# Altium schematic symbol library Electronic Devices_LIB.SchLib: 703 symbols (part 2 of 8) (continued)
## CONN_HEADER_JLINK_1.27mm_10p
designator J?, comment 3220-10-0300-00
Conn Shrouded Header (4 Sides) HDR 10 POS 1.27mm Solder ST SMD; Manufacturer: CNC Tech; Number of Positions: 10; Current Rating: 1A; Number of Contacts: 10NUMBER; Voltage Rating: 50V; Pitch: 0.05inch; Supplier 1: Digikey; Manufacturer Part Number: 3220-10-0300-00; RoHS: Yes; Category: Headers and Wire Housings; Stock 1: 504959; Pricing 1: 1=0.78, 10=0.676, 80=0.5575, 440=0.4848, 3200=0.3636, 6400=0.35148, 12800=0.32239 (USD); Mount: Surface Mount; Contact Plating: Gold; Contact Material: Brass; Contact Shape: Square; Contact Finish - Mating: GOLD; Insulation Material: Nylon; Min Operating Temperature: -40°C; Max Operating Temperature: 105°C; Number of Rows: 2; Connector Type: Header; Contact Type: Male Pin; Series: -; Packaging: Tray; Package Quantity: 320; Termination: Solder; Fastening Type: Pull; Height: 5.55mm; Row Spacing: 0.05inch; Flammability Rating: UL94 V-0; RoHS Compliant: Yes; ComponentLink1URL: https://datasheet.ciiva.com/18655/3220-xx-0300-00-18655365.pdf?src-supplier=Digikey; ComponentLink1Description: https://datasheet.ciiva.com/18655/3220-xx-0300-00-18655365.pdf?src-supplier=Digikey; Supplier Part Number 1: 1175-1629-ND
footprint CONN_JLINK_HEADER_322010030000
pins: 1, 2, 3, 4, 5, 6, 7, 8, 9, 10

## CONN_HEADER_MALE_2P_2.54_61300211121
designator J?, comment 61300211121
THT Vertical Pin Header WR-PHD, Pitch 2.54 mm, Single Row, 2 pins; Manufacturer: Wurth Electronics; Current Rating: 3A; Voltage Rating: 250V; Number of Positions: 2; Gender: 29Gender; Contact Resistance: 20mR; Pitch: 0.1inch; Supplier 1: Digikey; Manufacturer Part Number: 61300211121; RoHS: Yes; Category: Headers and Wire Housings; Stock 1: 91042; Pricing 1: 1=0.13, 10=0.113, 25=0.094, 50=0.079, 100=0.071, 1000=0.065 (USD); Mount: Through Hole; Contact Plating: Gold; Housing Material: PBT; Contact Material: Copper Alloy,Copper; Color: Black; Min Operating Temperature: -40°C; Max Operating Temperature: 125°C; Number of Rows: 1; Contact Gender: Male; Packaging: Bulk; Termination: Through Hole; Number of Contacts: 2; Series: WR-PHD; Contact Type: Male Pin; Operating Supply Voltage: 250V; Orientation: Vertical; Height: 8.94mm; Contact Mating Length: 0.236inch; Lead Free: Lead Free; RoHS Compliant: Yes; Reach SVHC Compliant: Unknown; ComponentLink1URL: https://datasheet.ciiva.com/13619/6130xx11121-48870-13619345.pdf?src-supplier=Mouser; ComponentLink1Description: https://datasheet.ciiva.com/13619/6130xx11121-48870-13619345.pdf?src-supplier=Mouser; Supplier Part Number 1: 732-5315-ND
footprint HEADER_MALE_HDRV2W110P0X254_1X2_508X254X854P
pins: 1, 2

## CONN_HEADER_MALE_3P_2.54mm_TSW-103-07-G-S
designator J?, comment TSW-103-07-G-S
Conn Unshrouded Header HDR 3 POS 2.54mm Solder ST Top Entry Thru-Hole Bulk; Manufacturer: Samtec; Number of Contacts: 3; Gender: Male; Max Current Rating: 7.6A; Max Voltage Rating (AC): 550V; Supplier 1: Digikey; Manufacturer Part Number: TSW-103-07-G-S; RoHS: Yes; Category: Board to Board Connectors; Stock 1: 5646; Pricing 1: 1=0.61, 10=0.494, 100=0.403, 500=0.3493, 1000=0.32848, 5000=0.28482, 10000=0.2735 (USD); Mount: Through Hole; Contact Plating: Gold; Contact Material: Bronze; Housing Color: Black; Housing Material: Polyester; Color: Black; Min Operating Temperature: -55°C; Max Operating Temperature: 125°C; Number of Rows: 1; Packaging: Bulk; Termination: Solder; Number of Positions: 3; Series: TSW; Contact Type: Male Pin; Orientation: Vertical; Package Quantity: 1; Length: 7.62mm; Pitch: 2.54mm; Depth: 2.54mm; Contact Mating Length: 0.23inch; RoHS Compliant: Yes; Lead Free: Lead Free; Reach SVHC Compliant: No; ComponentLink1URL: https://datasheet.ciiva.com/6889/tsw-xxx-xx-xxx-x-xx-xxx-mkt-6889655.pdf?src-supplier=Digikey; ComponentLink1Description: https://datasheet.ciiva.com/6889/tsw-xxx-xx-xxx-x-xx-xxx-mkt-6889655.pdf?src-supplier=Digikey; ComponentLink2URL: https://datasheet.ciiva.com/7124/tsw-th-7124622.pdf?src-supplier=Newark; ComponentLink2Description: https://datasheet.ciiva.com/7124/tsw-th-7124622.pdf?src-supplier=Newark; Supplier Part Number 1: SAM1029-03-ND
footprint CONN_HEADER_MALE_SAMTEC_TSW-103-07-G-S
pins: 1, 2, 3

## CONN_HEADER_MALE_4P_2.54mm
designator J?, comment 68001-204HLF
Conn Unshrouded Header HDR 4 POS 2.54mm Solder ST Thru-Hole Bag; Manufacturer: Amphenol ICC / FCI; Number of Positions: 4; Current Rating: 3A; Insulation Resistance: 5GR; Voltage Rating: 1.5kV; Contact Post Length: 3.05mm; Supplier 1: Digikey; Manufacturer Part Number: 68001-204HLF; RoHS: No; Category: Headers and Wire Housings; Stock 1: 3677; Pricing 1: 1=0.51, 10=0.388, 100=0.2643, 500=0.24106, 1000=0.19734, 5000=0.17678, 10000=0.17484 (USD); Mount: Through Hole; Contact Plating: Gold,GXT; Color: Black; Contact Material: Bronze; Housing Material: Thermoplastic; Min Operating Temperature: -65°C; Max Operating Temperature: 125°C; Packaging: Bulk; Number of Rows: 1; Termination: Solder; Contact Gender: Male; Number of Contacts: 4; Orientation: Straight; Series: BERGSTIK® II, MezzSelect™, Basics+; Contact Type: Male Pin; Package Quantity: 100; Pitch: 2.54mm; Contact Mating Length: 0.23inch; Radiation Hardening: No; Flammability Rating: UL94 V-0; ComponentLink1URL: http://uk.rs-online.com/webdocs/1450/0900766b81450c68.pdf?src-supplier=Rs; ComponentLink1Description: http://uk.rs-online.com/webdocs/1450/0900766b81450c68.pdf?src-supplier=Rs; ComponentLink2URL: http://components.arrow.com/part/dataview/42735081S8853857N8314?src-supplier=Arrow+Electronics; ComponentLink2Description: http://components.arrow.com/part/dataview/42735081S8853857N8314?src-supplier=Arrow+Electronics; ComponentLink3URL: https://cdn.amphenol-icc.com/media/wysiwyg/files/drawing/68000.pdf?src-supplier=Avnet; ComponentLink3Description: https://cdn.amphenol-icc.com/media/wysiwyg/files/drawing/68000.pdf?src-supplier=Avnet; ComponentLink4URL: https://cdn.amphenol-icc.com/media/wysiwyg/files/drawing/68000.pdf?src-supplier=Allied+Electronics; ComponentLink4Description: https://cdn.amphenol-icc.com/media/wysiwyg/files/drawing/68000.pdf?src-supplier=Allied+Electronics; ComponentLink5URL: https://datasheet.octopart.com/68001-204HLF-Amphenol-Communications-Solutions-datasheet-100449246.pdf?src-supplier=Future+Electronics; ComponentLink5Description: https://datasheet.octopart.com/68001-204HLF-Amphenol-Communications-Solutions-datasheet-100449246.pdf?src-supplier=Future+Electronics; ComponentLink6URL: https://cdn.amphenol-icc.com/media/wysiwyg/files/drawing/68000.pdf?src-supplier=Digikey; ComponentLink6Description: https://cdn.amphenol-icc.com/media/wysiwyg/files/drawing/68000.pdf?src-supplier=Digikey; ComponentLink7URL: https://datasheet.octopart.com/68001-204HLF-Amphenol-Communications-Solutions-datasheet-41232361.pdf?src-supplier=Element14; ComponentLink7Description: https://datasheet.octopart.com/68001-204HLF-Amphenol-Communications-Solutions-datasheet-41232361.pdf?src-supplier=Element14; ComponentLink8URL: https://cdn.amphenol-icc.com/media/wysiwyg/files/drawing/68000.pdf?src-supplier=Mouser; ComponentLink8Description: https://cdn.amphenol-icc.com/media/wysiwyg/files/drawing/68000.pdf?src-supplier=Mouser; ComponentLink9URL: https://cdn.amphenol-icc.com/media/wysiwyg/files/drawing/68000.pdf?src-supplier=TTI; ComponentLink9Description: https://cdn.amphenol-icc.com/media/wysiwyg/files/drawing/68000.pdf?src-supplier=TTI; ComponentLink10URL: https://cdn.amphenol-icc.com/media/wysiwyg/files/drawing/68000.pdf?src-supplier=Heilind+Electronics; ComponentLink10Description: https://cdn.amphenol-icc.com/media/wysiwyg/files/drawing/68000.pdf?src-supplier=Heilind+Electronics; ComponentLink11URL: https://datasheet.octopart.com/68001-204HLF-Amphenol-Communications-Solutions-datasheet-154727322.pdf?src-supplier=Master+Electronics; ComponentLink11Description: https://datasheet.octopart.com/68001-204HLF-Amphenol-Communications-Solutions-datasheet-154727322.pdf?src-supplier=Master+Electronics; Supplier Part Number 1: 609-3402-ND
footprint CONN_HDR_MALE_5P (2.54mm Pitch,tht)
pins: 1, 2, 3, 4

## CONN_HEADER_MALE_5P_2.54mm
designator J?, comment PH1-05-UA  (value not drawn)
Conn Unshrouded Header HDR 5 POS 2.54mm Solder ST Thru-Hole; Manufacturer: Adam Equipment; Number of Positions: 5; Manufacturer Part Number: PH1-05-UA; RoHS: Yes; Category: Connectors; Stock 1: 33214; Pricing 1: 1=0.10000, 10=0.07900, 100=0.05860, 500=0.04848, 1000=0.04242, 5000=0.03636, 10000=0.03535 (USD); Mount: Through Hole; Packaging: Bag; Pitch: 2.54mm; Lead Free: Lead Free; ComponentLink1URL: http://www.adam-tech.com/downloader.php?p=PH1-XX-UA.pdf&src-supplier=Digi-Key; ComponentLink1Description: http://www.adam-tech.com/downloader.php?p=PH1-XX-UA.pdf&src-supplier=Digi-Key; ComponentLink2URL: http://www.adam-tech.com/rick/FinalSingle/CatPg250-254.pdf?src-supplier=Future+Electronics; ComponentLink2Description: http://www.adam-tech.com/rick/FinalSingle/CatPg250-254.pdf?src-supplier=Future+Electronics; Supplier 1: Digi-Key; Supplier 2: Arrow Electronics; Supplier 3: Verical; Supplier Part Number 1: 2057-PH1-05-UA-ND; Supplier Part Number 2: PH1-05-UA; Supplier Part Number 3: PH1-05-UA; Supplier 4: Digi-Key; Supplier Part Number 4: 2057-PH1-06-UA-ND
footprint CONN_HDR_MALE_5P (2.54mm Pitch,tht)
pins: 1, 2, 3, 4, 5

## CONN_HEADER_MALE_6P_2.54mm
designator J?, comment PH1-06-UA
PH Series 6 Position Through Hole Single Row Straight .100 Header; Manufacturer: Adam Equipment; Number of Positions: 6; Pitch: 2.54mm; Supplier 1: Digi-Key; Manufacturer Part Number: PH1-06-UA; RoHS: Yes; Category: Connectors; Stock 1: 30623; Pricing 1: 1=0.13000, 10=0.09900, 100=0.07320, 500=0.06060, 1000=0.05302, 5000=0.04545, 10000=0.04419 (USD); Mount: Through Hole; Contact Plating: Gold; Number of Contacts: 6; Packaging: Bag; Number of Rows: 1; Lead Free: Lead Free; ComponentLink1URL: http://www.adam-tech.com/catalog/2012/page_312-315.pdf?src-supplier=Future+Electronics; ComponentLink1Description: http://www.adam-tech.com/catalog/2012/page_312-315.pdf?src-supplier=Future+Electronics; Supplier Part Number 1: 2057-PH1-06-UA-ND
footprint CONN_HDR_MALE_6P (2.54mm Pitch,tht)
pins: 1, 2, 3, 4, 5, 6

## CONN_HEADER_MALE_6P_2R_2.54mm_PH2-06-UA
designator J?, comment PH2-06-UA
Conn Unshrouded Header HDR 6 POS 2.54mm Solder ST Thru-Hole Bag; Manufacturer: Adam Equipment; Supplier 1: Digi-Key; Manufacturer Part Number: PH2-06-UA; RoHS: Yes; Category: Connectors; Stock 1: 52253; Pricing 1: 1=0.13, 10=0.1, 100=0.0735, 500=0.06084, 1000=0.05324, 5000=0.04563, 10000=0.04436 (USD); Lead Free: Lead Free; ComponentLink1URL: https://datasheet.ciiva.com/16479/page-292-295-16479745.pdf?src-supplier=Future+Electronics; ComponentLink1Description: https://datasheet.ciiva.com/16479/page-292-295-16479745.pdf?src-supplier=Future+Electronics; Supplier Part Number 1: 2057-PH2-06-UA-ND
footprint CONN_HDR_HDRV6W64P254_2X3_762X500X901P (Pitch 2.54mm)
pins: 1, 2, 3, 4, 5, 6

## CONN_HEADER_MALE_7P_2.54mm
designator J?, comment PH1-07-UA
Pin Header 7P .100" Pitch Plug; Manufacturer: Adam Equipment; Number of Contacts: 7; Supplier 1: Digi-Key; Manufacturer Part Number: PH1-07-UA; RoHS: No; Category: Connectors; Stock 1: 22523; Pricing 1: 1=0.15000, 10=0.11900, 100=0.08790, 500=0.07272, 1000=0.06363, 5000=0.05454, 10000=0.05303 (USD); Contact Plating: Gold; Packaging: Bag; Number of Rows: 1; Lead Free: Lead Free; Supplier Part Number 1: 2057-PH1-07-UA-ND
footprint CONN_HDR_MALE_7P (2.54mm Pitch,tht)
pins: 1, 2, 3, 4, 5, 6, 7

## CONN_HEADER_MALE_8P_2.54MM
designator J?, comment 2PH1-08-UA
Conn Unshrouded Header HDR 8 POS 2mm Solder ST Top Entry Thru-Hole Bag; Manufacturer: Adam Equipment; Number of Positions: 8; Voltage Rating (AC): 250V; Supplier 1: Arrow Electronics; Manufacturer Part Number: 2PH1-08-UA; RoHS: No; Category: Connectors; Stock 1: 8; Pricing 1: 1=0.1208, 10=0.1021, 100=0.1004 (USD); Mount: Through Hole; Contact Material: Brass; Contact Shape: Square; Contact Finish - Mating: GOLD; Insulation Material: PBT; Insulation Color: Black; Min Operating Temperature: -55°C; Max Operating Temperature: 105°C; Connector Type: Header; Fastening Type: Pull; Series: 2PH1; Packaging: Bulk; Contact Type: Male Pin; Number of Rows: 1; Termination: Solder; Flammability Rating: UL94 V-0; ComponentLink1URL: http://datasheet.octopart.com/2PH1-08-UA-Adam-Tech-datasheet-21182828.pdf?src-supplier=Arrow+Electronics; ComponentLink1Description: http://datasheet.octopart.com/2PH1-08-UA-Adam-Tech-datasheet-21182828.pdf?src-supplier=Arrow+Electronics; ComponentLink2URL: http://datasheet.octopart.com/2PH1-08-UA-Adam-Tech-datasheet-21182828.pdf?src-supplier=Allied+Electronics; ComponentLink2Description: http://datasheet.octopart.com/2PH1-08-UA-Adam-Tech-datasheet-21182828.pdf?src-supplier=Allied+Electronics; ComponentLink3URL: http://datasheet.octopart.com/2PH1-08-UA-Adam-Tech-datasheet-21182828.pdf?src-supplier=Digi-Key; ComponentLink3Description: http://datasheet.octopart.com/2PH1-08-UA-Adam-Tech-datasheet-21182828.pdf?src-supplier=Digi-Key; ComponentLink4URL: http://datasheet.octopart.com/2PH1-08-UA-Adam-Tech-datasheet-21182828.pdf?src-supplier=Beyond+Components; ComponentLink4Description: http://datasheet.octopart.com/2PH1-08-UA-Adam-Tech-datasheet-21182828.pdf?src-supplier=Beyond+Components; Supplier Part Number 1: 2PH1-08-UA
footprint CONN_HDR_MALE_8P (2.54mm Pitch,tht)
pins: 1, 2, 3, 4, 5, 6, 7, 8

## CONN_HEADER_MALE_10P_2.54mm_PH1-10-UA
designator J?, comment PH1-10-UA
Conn Unshrouded Header HDR 12 POS 2.54mm Solder RA Side Entry Thru-Hole Bag; Manufacturer: Adam Equipment; Number of Positions: 10; Voltage Rating (AC): 250V; Supplier 1: Digikey; Manufacturer Part Number: PH1-10-UA; RoHS: Yes; Category: Connectors; Stock 1: 3363; Pricing 1: 1=0.19, 10=0.144, 100=0.1095, 500=0.09102, 1000=0.08424, 5000=0.07078, 10000=0.06586 (USD); Contact Material: Brass; Contact Shape: Square; Contact Finish - Mating: GOLD; Insulation Material: PBT; Insulation Color: Black; Min Operating Temperature: -40°C; Max Operating Temperature: 105°C; Number of Rows: 1; Termination: Solder; Series: PH1; Connector Type: Header; Fastening Type: Pull; Packaging: Bulk; Contact Type: Male Pin; Pitch: 2.54mm; Flammability Rating: UL94 V-0; ComponentLink1URL: https://datasheet.ciiva.com/13676/page-292-295-13676646.pdf?src-supplier=Mouser; ComponentLink1Description: https://datasheet.ciiva.com/13676/page-292-295-13676646.pdf?src-supplier=Mouser; Supplier Part Number 1: 2057-PH1-10-UA-ND
footprint CONN_HEADER_MALE_10P
pins: 1, 2, 3, 4, 5, 6, 7, 8, 9, 10

## CONN_HEADER_MALE_10P_2R_1.27MM
designator J?, comment 20021121-00010C4LF
Conn Unshrouded Header HDR 10 POS 1.27mm Solder ST Top Entry SMD Minitek127® T/R; Manufacturer: Amphenol ICC / FCI; Number of Contacts: 10; Current Rating: 1A; Voltage Rating: 125V; Contact Resistance: 30mR; Row Spacing: 0.05inch; Stack Height: 3mm; Supplier 1: Newark; Manufacturer Part Number: 20021121-00010C4LF; RoHS: No; Category: Headers and Wire Housings; Stock 1: 9600; Pricing 1: 1=0.363, 1200=0.363, 2400=0.363, 4800=0.363, 7200=0.363, 12000=0.363 (USD); Mount: Surface Mount; Contact Plating: Gold; Color: Black; Contact Material: Copper Alloy,Copper; Housing Material: Thermoplastic; Housing Color: Black; Min Operating Temperature: -40°C; Max Operating Temperature: 85°C; Series: Minitek; Packaging: Tape and Reel; Number of Rows: 2; Termination: Solder; Package Quantity: 600; Connector Type: Header; Contact Type: Male Pin; Number of Positions: 10; Orientation: Straight; Max Voltage Rating (AC): 125V; Length: 6.35mm; Pitch: 1.27mm; Contact Mating Length: 0.12inch; Depth: 3.4mm; Radiation Hardening: No; Reach SVHC Compliant: No; Supplier Part Number 1: 28X2682
footprint CONN_HDR_MALE_10P_2R (Pitch    0.050" (1.27mm))
pins: 1, 2, 3, 4, 5, 6, 7, 8, 9, 10

## CONN_HEADER_MALE_15P_2.54mm
designator J?, comment PEC15SFAN
CONN HEADER .100 SINGL STR 15POS; Manufacturer: Sullins; Number of Positions: 15; Gender: Male; Pitch: 0.1inch; Supplier 1: Digikey; Manufacturer Part Number: PEC15SFAN; RoHS: Yes; Category: Connectors; Stock 1: 17155; Pricing 1: 1=0.82, 10=0.695, 100=0.6239, 500=0.5105, 1000=0.45378, 5000=0.40516 (USD); Mount: Through Hole; Color: Black; Contact Plating: Tin; Housing Color: Black; Contact Material: Bronze; Housing Material: Plastic; Packaging: Bulk; Package Quantity: 1; Number of Rows: 1; Termination: Solder; Number of Contacts: 15; Contact Type: Male Pin; Length: 38.1mm; Width: 2.54mm; Height: 2.54mm; Contact Mating Length: 0.318inch; Lead Free: Lead Free; RoHS Compliant: Yes; ComponentLink1URL: https://s3.amazonaws.com/catalogspreads-pdf/PAGE108-109%20.100%20MALE%20HDR.pdf?src-supplier=Digikey; ComponentLink1Description: https://s3.amazonaws.com/catalogspreads-pdf/PAGE108-109%20.100%20MALE%20HDR.pdf?src-supplier=Digikey; Supplier Part Number 1: S1212E-15-ND
footprint HEADER_FEM_RHDR15W85P0X254_1X15_3708X254X850P
pins: 1, 2, 3, 4, 5, 6, 7, 8, 9, 10, 11, 12, 13, 14, 15

## CONN_HEADER_MALE_18P_2R_1.27mm_20021121-00018T4LF
designator J?, comment 20021121-00018T4LF
Conn Unshrouded Header HDR 18 POS 1.27mm Solder ST SMD Tube; Manufacturer: Amphenol ICC / FCI; Current Rating: 18A; Voltage Rating: 125V; Number of Positions: 18; Gender: Male; Row Spacing: 0.05inch; Supplier 1: Digikey; Manufacturer Part Number: 20021121-00018T4LF; RoHS: Yes; Category: Connectors; Stock 1: 2140; Pricing 1: 1=1.53, 52=1.24788, 104=1.19115, 520=0.99263, 1040=0.85083, 5044=0.7544, 10036=0.73738 (USD); Mount: Surface Mount; Contact Plating: Gold; Color: Black; Contact Material: Nickel; Housing Material: Plastic; Packaging: Rail/Tube; Number of Rows: 2; Package Quantity: 52; Termination: Solder; Number of Contacts: 18; Series: Minitek 127® 20021121; Contact Type: Male Pin; Pitch: 1.27mm; Contact Mating Length: 0.12inch; RoHS Compliant: Yes; ComponentLink1URL: https://datasheet.ciiva.com/409/20021121-409255.pdf?src-supplier=Digikey; ComponentLink1Description: https://datasheet.ciiva.com/409/20021121-409255.pdf?src-supplier=Digikey; ComponentLink2URL: https://datasheet.ciiva.com/10033/20021121-10033349.pdf?src-supplier=Avnet; ComponentLink2Description: https://datasheet.ciiva.com/10033/20021121-10033349.pdf?src-supplier=Avnet; ComponentLink3URL: https://datasheet.ciiva.com/13875/20021121-13875197.pdf?src-supplier=Mouser; ComponentLink3Description: https://datasheet.ciiva.com/13875/20021121-13875197.pdf?src-supplier=Mouser; Supplier Part Number 1: 609-3731-ND
footprint CONN_18P_2R_AMPHENOL_20021121-00018T4LF
pins: 1, 2, 3, 4, 5, 6, 7, 8, 9, 10, 11, 12, 13, 14, 15, 16, 17, 18

## CONN_HEADER_MALE_24P_2R_2.54mm_SBH11-NBPC-D12-SM-BK
designator J?, comment SBH11-NBPC-D12-SM-BK
Conn Header SMD 24POS 2.54MM; Manufacturer: Sullins; Number of Positions: 24; Pitch: 0.1inch; Supplier 1: Digikey; Manufacturer Part Number: SBH11-NBPC-D12-SM-BK; RoHS: Yes; Category: Connectors; Stock 1: 4854; Pricing 1: 1=1.38, 15=1.19733, 105=1.07019, 510=0.8918, 1005=0.7644, 5010=0.728 (USD); Mount: Surface Mount; Color: Black; Contact Plating: Gold; Package Quantity: 1; Number of Rows: 2; Packaging: Rail/Tube; Termination: Solder; Series: SBH11; Contact Type: Male Pin; Row Spacing: 0.1inch; RoHS Compliant: Yes; ComponentLink1URL: https://datasheet.ciiva.com/730/sbh11-nbpc-dxx-sm-xx-730936.pdf?src-supplier=Digikey; ComponentLink1Description: https://datasheet.ciiva.com/730/sbh11-nbpc-dxx-sm-xx-730936.pdf?src-supplier=Digikey; Supplier Part Number 1: S9189-ND
footprint CONN_HEADER_MALE_SULLINS_SBH11-NBPC-D12-SM-BK (PITCH 2.54mm)
pins: 1, 2, 3, 4, 5, 6, 7, 8, 9, 10, 11, 12, 13, 14, 15, 16, 17, 18, 19, 20, 21, 22, 23, 24

## CONN_JACK_AUDIO_3.5MM_SJ-3523-SMT-TR
designator J?, comment SJ-3523-SMT-TR
3.5 mm, Stereo, Right Angle, Surface Mount (SMT), Audio Jack Connector; Manufacturer: CUI Devices; Body Color: Black; Shielding: Unshielded; Current Rating: 1A; Number of Conductors: 3; Voltage Rating: 12V; Gender: Female; Number of Ports: 1; Supplier 1: Digikey; Manufacturer Part Number: SJ-3523-SMT-TR; RoHS: Yes; Category: Audio / Video Connectors; Stock 1: 5900; Pricing 1: 1=1.24, 10=0.936, 25=0.84, 50=0.7754, 100=0.7168, 250=0.64776, 500=0.60138, 1000=0.56013, 2000=0.52159, 3000=0.50075, 5000=0.47616, 7000=0.46093, 10000=0.44558 (USD); Mount: Surface Mount; Contact Plating: Silver; Contact Material: Brass; Housing Material: Nylon; Color: Black; Min Operating Temperature: -25°C; Max Operating Temperature: 85°C; Termination: Solder; Orientation: Horizontal; Packaging: Tape and Reel; Series: SJ; Number of Contacts: 3; Height: 5.37mm; Lead Free: Lead Free; ComponentLink1URL: https://www.cuidevices.com/product/resource/digikeypdf/sj-352x-smt.pdf?src-supplier=Digikey; ComponentLink1Description: https://www.cuidevices.com/product/resource/digikeypdf/sj-352x-smt.pdf?src-supplier=Digikey; ComponentLink2URL: https://datasheet.octopart.com/SJ-3523-SMT-TR-CUI-datasheet-102990032.pdf?src-supplier=Future+Electronics; ComponentLink2Description: https://datasheet.octopart.com/SJ-3523-SMT-TR-CUI-datasheet-102990032.pdf?src-supplier=Future+Electronics; ComponentLink3URL: https://datasheet.octopart.com/SJ-3523-SMT-TR-CUI-Devices-datasheet-103113656.pdf?src-supplier=Electro+Sonic; ComponentLink3Description: https://datasheet.octopart.com/SJ-3523-SMT-TR-CUI-Devices-datasheet-103113656.pdf?src-supplier=Electro+Sonic; Supplier Part Number 1: CP-3523SJCT-ND
footprint CONN_JACK_SJ3523SMTTR
pins: 1 SLEEVE, 2 TIP, 3 RING

## CONN_JACK_AUDIO_STEREO_3.5mm_STX-3000
designator J?, comment STX-3000
Phone Connectors 3.5MM Pcb Stereo Blk Plastic Non Threaded; Manufacturer: Kycon; Body Color: Black; Gender: Female; Voltage Rating: 250V; Number of Contacts: 3; Shielding: Unshielded; Supplier 1: Digi-Key; Manufacturer Part Number: STX-3000; RoHS: Yes; Category: Connectors; Stock 1: 83225; Pricing 1: 1=0.66, 25=0.494, 100=0.4322, 500=0.4116, 2500=0.3132 (USD); Mount: Through Hole; Color: Black; Contact Material: Copper Alloy,Bronze; Contact Plating: Tin; Housing Material: PBT; Min Operating Temperature: -25°C; Max Operating Temperature: 80°C; Package Quantity: 500; Packaging: Bulk; Series: STX-3000; Termination: Kinked Pin; Orientation: Horizontal; Number of Positions: 3; Radiation Hardening: No; RoHS Compliant: Yes; ComponentLink1URL: https://datasheet.ciiva.com/5053/stx-3000-182293-5053902.pdf?src-supplier=Mouser; ComponentLink1Description: https://datasheet.ciiva.com/5053/stx-3000-182293-5053902.pdf?src-supplier=Mouser; Supplier Part Number 1: 2092-STX-3000-ND
footprint CONN_JACK_STX3000 (3.50mm (0.141", 1/8", Mini Plug))
pins: 1, 2, 3

## CONN_JACK_DC_24V_5A
designator J?, comment DC-026-5A-2.5
Straight DC Power Receptacle 260℃ Brass -20℃~+70℃ 2.5mm 5.6mm 5A 24V Plugin AC/DC Power Connectors ROHS; Manufacturer: XKB Connectivity; Gender: Male; Shielding: Unshielded; Connector Type: Jack; Insulation Resistance: 100MR; Number of Conductors: 2; RoHS: Yes; Category: Uncategorized; Mount: Panel,Bulkhead,Front Side Nut; Color: Black; Contact Plating: Nickel,Silver; Contact Material: Brass; Housing Material: Thermoplastic; Housing Color: Black; Min Operating Temperature: -20°C; Max Operating Temperature: 70°C; Series: -; Termination: Solder; Package Quantity: 500; Current Rating: 5A; Contact Gender: Male; Voltage Rating: 24V; Orientation: Vertical; Lead Free: Lead Free; RoHS Compliant: Yes; ComponentLink1Description: Supplier; ComponentLink1URL: https://www.lcsc.com/product-detail/AC-DC-Power-Connectors_XKB-Connectivity-DC-026-5A-2-5_C500103.html?utm_source=octopart&utm_medium=cpc&utm_campaign=DC-026-5A-2.5; Supplier: Lcsc; Manufacturer Part Number: DC-026-5A-2.5
footprint CONN_XKB Connectivity DC-026-5A-2.5 (Straight DC Power Receptacle 260? Brass -20?~+70? 2.5mm 5.6mm 5A 24V Plugin AC/DC Power Connectors ROHS)
pins: 1, 2, 3

## CONN_JST_PH_2P_2mm_B2B-PH-SM4-TBT(LF)(SN)
designator J?, comment B2B-PH-SM4-TBT(LF)(SN)
Connector Header, PH Series, 2 Position, 2.00mm, 100V, Surface Mount, Solder, Pick and Place, Natural.; Manufacturer: JST; Number of Positions: 2; Pitch: 2mm; Mated Stacking Heights: 8.6mm; Supplier 1: Verical; Manufacturer Part Number: B2B-PH-SM4-TBT(LF)(SN); RoHS: Yes; Category: Headers and Wire Housings; Stock 1: 44000; Pricing 1: 1000=0.3721 (USD); Mount: Surface Mount; Contact Material: Copper Alloy; Contact Shape: Square; Contact Finish - Mating: TIN; Insulation Material: Nylon; Insulation Color: Natural; Min Operating Temperature: -25°C; Max Operating Temperature: 85°C; Packaging: Cut Tape; Number of Rows: 1; Series: PH; Contact Type: Male Pin; Connector Type: Header; Fastening Type: Detent; Termination: Solder; Voltage Rating: 100V; Orientation: 5495OrientationType; Flammability Rating: UL94 V-0; ComponentLink1URL: https://datasheet.ciiva.com/26894/getdatasheetpartid-473167-26894757.pdf?src-supplier=Verical; ComponentLink1Description: https://datasheet.ciiva.com/26894/getdatasheetpartid-473167-26894757.pdf?src-supplier=Verical; ComponentLink2URL: https://datasheet.ciiva.com/732/eph-732907.pdf?src-supplier=Digikey; ComponentLink2Description: https://datasheet.ciiva.com/732/eph-732907.pdf?src-supplier=Digikey; ComponentLink3URL: https://datasheet.ciiva.com/14800/eph-14800607.pdf?src-supplier=Digikey; ComponentLink3Description: https://datasheet.ciiva.com/14800/eph-14800607.pdf?src-supplier=Digikey; Supplier Part Number 1: B2B-PH-SM4-TBT(LF)(SN)
footprint CONN_JST_B2B-PH-SM4-TBT(LF)(SN)
pins: 1, 2, SH

## CONN_JST_PH_2P_2mm_B2B-PH-SM4-TBT(LF)(SN)_JLCPCB
designator J?, comment B2B-PH-SM4-TBT(LF)(SN)
1x2P 2P PH 1 Tin 2mm 2 -25℃~+85℃ 2A Copper Alloy Brick nogging SMD,P=2mm  Wire To Board / Wire To Wire Connector ROHS; Manufacturer: JST; Number of Positions: 2; Connector Type: Header; Voltage Rating: 100V; Mated Stacking Heights: 8.6mm; Supplier: Jlcpcb; Manufacturer Part Number: B2B-PH-SM4-TBT(LF)(SN); RoHS: Yes; Category: Headers and Wire Housings; Mount: Surface Mount; Contact Material: Copper Alloy; Contact Shape: Square; Contact Finish - Mating: TIN; Insulation Material: Nylon; Insulation Color: Natural; Min Operating Temperature: -25°C; Max Operating Temperature: 85°C; Packaging: Cut Tape; Number of Rows: 1; Series: PH; Contact Type: Male Pin; Fastening Type: Detent; Termination: Solder; Orientation: 5495OrientationType; Pitch: 2mm; Flammability Rating: UL94 V-0; ComponentLink1URL: https://datasheet.ciiva.com/26894/getdatasheetpartid-473167-26894757.pdf?src-supplier=Verical; ComponentLink1Description: https://datasheet.ciiva.com/26894/getdatasheetpartid-473167-26894757.pdf?src-supplier=Verical; ComponentLink2URL: https://datasheet.ciiva.com/732/eph-732907.pdf?src-supplier=Digikey; ComponentLink2Description: https://datasheet.ciiva.com/732/eph-732907.pdf?src-supplier=Digikey; ComponentLink3URL: https://datasheet.ciiva.com/14800/eph-14800607.pdf?src-supplier=Digikey; ComponentLink3Description: https://datasheet.ciiva.com/14800/eph-14800607.pdf?src-supplier=Digikey; JLCPCB Part Number: C265003
footprint CONN_JST_B2B-PH-SM4-TBT(LF)(SN)
pins: 1, 2, SH

## CONN_JST_PH_2P_2MM_S2B-PH-K-S(LF)(SN)
designator J?, comment S2B-PH-K-S(LF)(SN)
Header for PCB; pitch 2.00mm; 2-contacts; THT; male; side entry; 100V/2A; Manufacturer: JST; Contact Resistance: 20mR; Max Current Rating: 2A; Voltage Rating: 100V; Number of Positions: 2; Insulation Resistance: 1GR; Pitch: 2mm; Supplier 1: Verical; Manufacturer Part Number: S2B-PH-K-S(LF)(SN); RoHS: Yes; Category: Headers and Wire Housings; Stock 1: 7225; Pricing 1: 439=0.139 (USD); Mount: Through Hole; Number of Pins: 2; Contact Material: Brass,Tin,Bronze; Contact Plating: Tin,Copper; Housing Color: White; Housing Material: Polyamide; Color: Natural,White; Min Operating Temperature: -25°C; Max Operating Temperature: 85°C; Packaging: Bulk; Number of Rows: 1; Current Rating: 2A; Termination: Solder; Fastening Type: Detent; Number of Contacts: 2; Max Voltage Rating (AC): 100V; Orientation: Right Angle; Gender: Male; Series: PH; Contact Type: Male Pin; Number of Poles: 2; Voltage Rating (AC): 100V; Max Voltage Rating (DC): 100V; Working Voltage: 100V; Length: 5.9mm; Width: 4.5mm; Height: 9.4mm; Depth: 7.6mm; Lead Pitch: 2mm; Contact Mating Length: 0.13inch; Reach SVHC Compliant: No; Lead Free: Lead Free; Flammability Rating: UL94 V-0; ComponentLink1URL: https://datasheet.ciiva.com/11747/0900766b8082f558-11747128.pdf?src-supplier=Rs; ComponentLink1Description: https://datasheet.ciiva.com/11747/0900766b8082f558-11747128.pdf?src-supplier=Rs; ComponentLink2URL: https://datasheet.ciiva.com/712/eph-712447.pdf?src-supplier=Digi-Key; ComponentLink2Description: https://datasheet.ciiva.com/712/eph-712447.pdf?src-supplier=Digi-Key; ComponentLink3URL: https://datasheet.ciiva.com/8052/80564-8052207.pdf?src-supplier=Element14; ComponentLink3Description: https://datasheet.ciiva.com/8052/80564-8052207.pdf?src-supplier=Element14; ComponentLink4URL: https://datasheet.ciiva.com/26894/getdatasheetpartid-641020-26894599.pdf?src-supplier=Verical; ComponentLink4Description: https://datasheet.ciiva.com/26894/getdatasheetpartid-641020-26894599.pdf?src-supplier=Verical; ComponentLink5URL: https://datasheet.ciiva.com/16484/s2b-ph-k-slfsn-16484405.pdf?src-supplier=Future+Electronics; ComponentLink5Description: https://datasheet.ciiva.com/16484/s2b-ph-k-slfsn-16484405.pdf?src-supplier=Future+Electronics; Supplier Part Number 1: S2B-PH-K-S(LF)(SN)
footprint CONN_JST_S2B-PH-K-S(LF)(SN) (pitch 2.00mm; 2-contacts; THT)
pins: 1, 2

## CONN_JST_PH_3P_2MM_SM03B-PASS-TBT
designator J?, comment SM03B-PASS-TBT
Conn Header SMD R/a 3POS 2MM; Manufacturer: JST; Supplier 1: Digikey; Manufacturer Part Number: SM03B-PASS-TBT; RoHS: No; Stock 1: 258662; Pricing 1: 1=0.78, 10=0.657, 100=0.5904, 500=0.48304, 1000=0.42938, 2000=0.40254, 3000=0.38912, 5000=0.3757, 10000=0.35692, 25000=0.34887 (USD); Supplier Part Number 1: 455-SM03B-PASS-TBTCT-ND
footprint CONN_JST_SM03B-PASS-TBT_LF_SN_MFG
pins: 1, 2, 3, SH

## CONN_JST_PH_4P_2mm
designator J?, comment B4B-PH-SM4-TBT(LF)(SN)
Conn Shrouded Header HDR 4 POS 2mm Solder ST SMD T/R; Manufacturer: JST; Number of Positions: 4; Connector Type: Male Pin; Contact Resistance: 20mR; Max Current Rating: 2A; Max Voltage Rating (AC): 100V; Pitch: 0.079inch; Manufacturer Part Number: B4B-PH-SM4-TBT(LF)(SN); RoHS: Yes; Category: Headers and Wire Housings; Stock 1: 125644; Pricing 1: 1=0.91000, 10=0.76800, 100=0.68920, 500=0.56390 (USD); Mount: Surface Mount; Contact Plating: Tin,Copper; Color: Natural; Contact Material: Copper Alloy; Housing Color: Beige; Housing Material: Polyamide; Min Operating Temperature: -25°C; Max Operating Temperature: 85°C; Number of Rows: 1; Packaging: Tape and Reel; Termination: Solder; Series: PH; Contact Type: Male Pin; Package Quantity: 1; Orientation: Straight; Fastening Type: Detent; Length: 11.95mm; Depth: 5mm; Contact Mating Length: 0.13inch; Lead Free: Lead Free; ComponentLink1URL: https://datasheet.ciiva.com/16291/b4b-ph-sm4-tbtlfsn-16291402.pdf?src-supplier=Future+Electronics; ComponentLink1Description: https://datasheet.ciiva.com/16291/b4b-ph-sm4-tbtlfsn-16291402.pdf?src-supplier=Future+Electronics; ComponentLink2URL: https://datasheet.ciiva.com/6840/eph-6840791.pdf?src-supplier=Digi-Key; ComponentLink2Description: https://datasheet.ciiva.com/6840/eph-6840791.pdf?src-supplier=Digi-Key; Supplier 1: Digi-Key; Supplier 2: Future Electronics; Supplier 3: Digi-Key; Supplier Part Number 1: 455-2873-6-ND; Supplier Part Number 2: 3556719; Supplier Part Number 3: 455-2873-2-ND
footprint CONN_JST_0_MFG_4P (Connector Header Surface Mount 4 position 0.079" (2.00mm))
pins: 0 SH, 1, 2, 3, 4

## CONN_JST_PH_4P_2mm_JLCPCB
designator J?, comment B4B-PH-SM4-TBT(LF)(SN)
1x4P PH 1 Tin 2mm 4 -25℃~+85℃ 2A Copper Alloy Brick nogging SMD,P=2mm  Wire To Board / Wire To Wire Connector ROHS; Manufacturer: JST; Number of Positions: 4; Connector Type: Male Pin; Contact Resistance: 20mR; Max Voltage Rating (AC): 100V; Pitch: 0.079inch; Manufacturer Part Number: B4B-PH-SM4-TBT(LF)(SN); RoHS: Yes; Category: Headers and Wire Housings; Mount: Surface Mount; Contact Plating: Tin,Copper; Color: Natural; Contact Material: Copper Alloy; Housing Color: Beige; Housing Material: Polyamide; Min Operating Temperature: -25°C; Max Operating Temperature: 85°C; Number of Rows: 1; Packaging: Tape and Reel; Termination: Solder; Series: PH; Contact Type: Male Pin; Max Current Rating: 2A; Package Quantity: 1; Orientation: Straight; Fastening Type: Detent; Length: 11.95mm; Depth: 5mm; Contact Mating Length: 0.13inch; Lead Free: Lead Free; ComponentLink1URL: https://datasheet.ciiva.com/16291/b4b-ph-sm4-tbtlfsn-16291402.pdf?src-supplier=Future+Electronics; ComponentLink1Description: https://datasheet.ciiva.com/16291/b4b-ph-sm4-tbtlfsn-16291402.pdf?src-supplier=Future+Electronics; ComponentLink2URL: https://datasheet.ciiva.com/6840/eph-6840791.pdf?src-supplier=Digi-Key; ComponentLink2Description: https://datasheet.ciiva.com/6840/eph-6840791.pdf?src-supplier=Digi-Key; Supplier: Jlcpcb; JLCPCB Part Number: C265116
footprint CONN_JST_0_MFG_4P (Connector Header Surface Mount 4 position 0.079" (2.00mm))
pins: 0 SH, 1, 2, 3, 4

## CONN_JST_PH_5P_2mm
designator J?, comment B5B-PH-SM4-TBT(LF)(SN)
Conn Shrouded Header HDR 5 POS 2mm Solder ST Top Entry SMD T/R; Manufacturer: JST; Number of Positions: 5; Supplier 1: Digi-Key; Manufacturer Part Number: B5B-PH-SM4-TBT(LF)(SN); RoHS: Yes; Category: Headers and Wire Housings; Stock 1: 18001; Pricing 1: 1=0.97000, 10=0.81500, 100=0.73220, 500=0.59904 (USD); Mount: Surface Mount; Termination: Solder; Pitch: 2mm; Lead Free: Lead Free; ComponentLink1URL: https://datasheet.ciiva.com/16417/eph-16417918.pdf?src-supplier=Future+Electronics; ComponentLink1Description: https://datasheet.ciiva.com/16417/eph-16417918.pdf?src-supplier=Future+Electronics; Supplier Part Number 1: 455-3362-1-ND
footprint CONN_JST_0_MFG_5P (Connector Header Surface Mount 5 position 0.079" (2.00mm))
pins: 0 SH, 1, 2, 3, 4, 5

## CONN_JST_PH_RA_2P_2MM
designator J?, comment S2B-PH-SM4-TB
Header S2B-PH-SM4-TB, 2.00mm, 2-contacts, side entry, SMT, /1000/reel; Manufacturer: JST; Number of Poles: 2; Pitch: 2mm; Supplier 1: Digi-Key; Manufacturer Part Number: S2B-PH-SM4-TB; RoHS: Yes; Stock 1: 22776; Pricing 1: 1=0.58, 10=0.503, 100=0.4143, 500=0.36024 (USD); Case/Package: SMD/SMT; Orientation: Horizontal; Length: 7.9mm; Width: 7.6mm; Height: 5.5mm; Supplier Part Number 1: 455-S2B-PH-SM4-TBCT-ND
footprint CONN_JST_S2BPHSM4TBLFSN (Surface Mount, Right Angle 2 position 0.079" (2.00mm)
pins: 1, 2, SH

## CONN_JST_PH_RA_2P_2MM_JLCPCB
designator J?, comment S2B-PH-SM4-TB(LF)(SN)
1x2P PH 1 Tin 2mm male 2 -25℃~+85℃ Copper Alloy 2A Surface Mount SMD,P=2mm  Wire To Board / Wire To Wire Connector ROHS; Manufacturer: JST; Number of Poles: 2; Supplier 1: jlcpcb; Manufacturer Part Number: S2B-PH-SM4-TB(LF)(SN); RoHS: Yes; Case/Package: SMD/SMT; Orientation: Horizontal; Length: 7.9mm; Width: 7.6mm; Height: 5.5mm; Pitch: 2mm; JLCPCB Part Number: C295747
footprint CONN_JST_S2BPHSM4TBLFSN (Surface Mount, Right Angle 2 position 0.079" (2.00mm)
pins: 1, 2, SH

## CONN_JST_PH_RA_4P_2mm
designator J?, comment S4B-PH-SM4-TB(LF)(SN
Connector Header, PH Series, 4 Position, Side Entry, 2.00mm, Solder, Surface Mount, Natural.; Manufacturer: JST; Current Rating: 2A; Gender: Male; Voltage Rating (AC): 100V; Number of Contacts: 4; Insulation Resistance: 1GR; Pitch: 2mm; Manufacturer Part Number: S4B-PH-SM4-TB(LF)(SN; RoHS: No; Category: Connectors; Stock 1: 31921; Pricing 1: 1=0.77000, 10=0.67500, 100=0.55680, 500=0.48414 (USD); Color: White; Contact Material: Copper Alloy; Contact Plating: Tin; Housing Color: Natural; Housing Material: Nylon; Packaging: Cut Tape; Number of Rows: 1; Termination: Solder; Voltage Rating: 100V; Orientation: Right Angle; Number of Positions: 4; Length: 11.9mm; Width: 7.6mm; Height: 5.5mm; Reach SVHC Compliant: Yes; Lead Free: Lead Free; Flammability Rating: UL94 V-0; ComponentLink1URL: http://uk.rs-online.com/webdocs/13ce/0900766b813ce4c5.pdf?src-supplier=Rs; ComponentLink1Description: http://uk.rs-online.com/webdocs/13ce/0900766b813ce4c5.pdf?src-supplier=Rs; Supplier 1: Digi-Key; Supplier 2: Newark; Supplier 3: Future Electronics; Supplier Part Number 1: 455-1751-1-ND; Supplier Part Number 2: 38K8075; Supplier Part Number 3: 7687031
footprint CONN_JST_S4B-PH-SM4-TB_LF_SN_0 (Connector Header Surface Mount, Right Angle 4 position 0.079" (2.00mm))
pins: 0 SH, 1, 2, 3, 4

## CONN_JST_PH_RA_4P_2mm_JLCPCB
designator J?, comment S4B-PH-SM4-TB(LF)(SN
1x4P PH 1 Tin 2mm 4 -25℃~+85℃ 2A Copper Alloy Surface Mount SMD,P=2mm Wire To Board / Wire To Wire Connector ROHS; Manufacturer: JST; Gender: Male; Voltage Rating (AC): 100V; Number of Contacts: 4; Insulation Resistance: 1GR; Manufacturer Part Number: S4B-PH-SM4-TB(LF)(SN; RoHS: No; Category: Connectors; Color: White; Contact Material: Copper Alloy; Contact Plating: Tin; Housing Color: Natural; Housing Material: Nylon; Current Rating: 2A; Packaging: Cut Tape; Number of Rows: 1; Termination: Solder; Voltage Rating: 100V; Orientation: Right Angle; Number of Positions: 4; Length: 11.9mm; Width: 7.6mm; Height: 5.5mm; Pitch: 2mm; Reach SVHC Compliant: Yes; Lead Free: Lead Free; Flammability Rating: UL94 V-0; Supplier 1: jlcpcb; JLCPCB Part Number: C265102
footprint CONN_JST_S4B-PH-SM4-TB_LF_SN_0 (Connector Header Surface Mount, Right Angle 4 position 0.079" (2.00mm))
pins: 0 SH, 1, 2, 3, 4

## CONN_JST_PH_RA_5P_2mm
designator J?, comment S5B-PH-SM4-TB(LF)(SN)
Conn Shrouded Header (4 Sides) HDR 5 POS 2mm Solder RA SMD T/R; Manufacturer: JST; Contact Resistance: 20mR; Current Rating: 2A; Voltage Rating (AC): 100V; Number of Poles: 5; Insulation Resistance: 1GR; Gender: Male; Manufacturer Part Number: S5B-PH-SM4-TB(LF)(SN); RoHS: Yes; Category: Connectors; Stock 1: 35118; Pricing 1: 1=0.81000, 10=0.70600, 100=0.58210, 500=0.50618 (USD); Mount: Surface Mount; Color: Natural,White; Contact Material: Copper Alloy,Tin,Bronze,Brass; Contact Plating: Tin,Copper; Housing Color: Beige; Housing Material: Polyamide; Contact Shape: Square; Contact Finish - Mating: TIN; Insulation Material: Nylon; Insulation Color: Natural; Min Operating Temperature: -25°C; Max Operating Temperature: 85°C; Packaging: Tape and Reel; Number of Rows: 1; Fastening Type: Detent; Max Current Rating: 2A; Number of Positions: 5; Termination: Solder; Max Voltage Rating (AC): 100V; Number of Contacts: 5; Working Voltage: 100V; Orientation: Right Angle; Connector Type: Header; Series: PH; Contact Type: Male Pin; Voltage Rating: 100V; Length: 13.9mm; Width: 5mm; Height: 9.4mm; Lead Pitch: 2mm; Pitch: 2mm; Contact Mating Length: 0.13inch; Depth: 8.6mm; Reach SVHC Compliant: Yes; Lead Free: Lead Free; Flammability Rating: UL94 V-0; ComponentLink1URL: https://datasheet.ciiva.com/712/eph-712755.pdf?src-supplier=Digi-Key; ComponentLink1Description: https://datasheet.ciiva.com/712/eph-712755.pdf?src-supplier=Digi-Key; ComponentLink2URL: https://datasheet.ciiva.com/26894/getdatasheetpartid-641042-26894630.pdf?src-supplier=Verical; ComponentLink2Description: https://datasheet.ciiva.com/26894/getdatasheetpartid-641042-26894630.pdf?src-supplier=Verical; Supplier 1: Digi-Key; Supplier 2: Arrow Electronics; Supplier 3: Newark; Supplier Part Number 1: 455-1752-1-ND; Supplier Part Number 2: S5B-PH-SM4-TB(LF)(SN); Supplier Part Number 3: 38K8079
footprint CONN_JST_S5B-PH-SM4-TB_LF_SN_0 (Connector Header Surface Mount, Right Angle 5 position 0.079" (2.00mm))
pins: 0 SH, 1, 2, 3, 4, 5

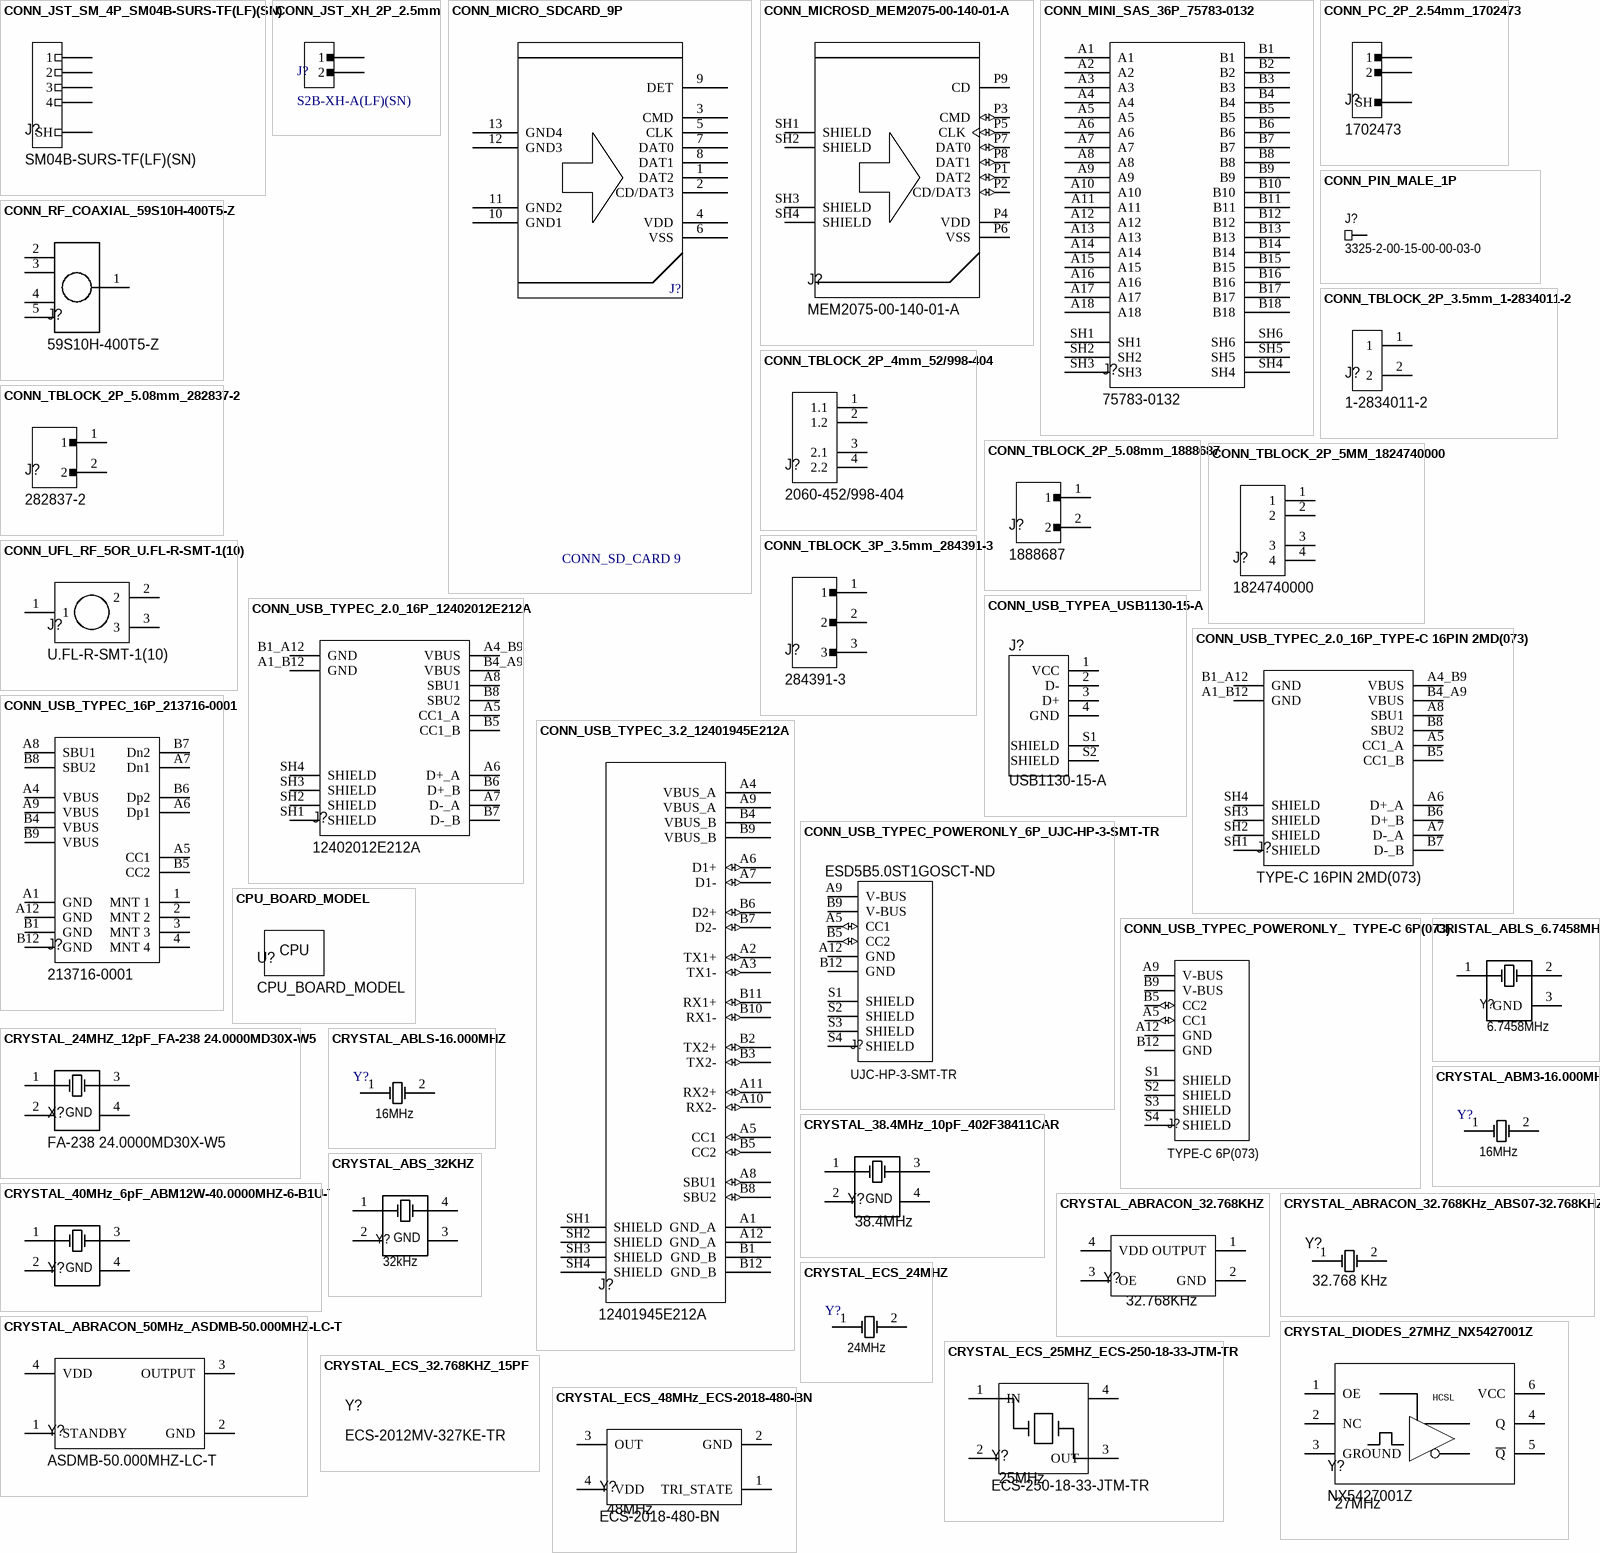
[diagram p5: symbols CONN_JST_SM_4P_SM04B-SURS-TF(LF)(SN) to CRYSTAL_ECS_48MHz_ECS-2018-480-BN]

## CONN_JST_SM_4P_SM04B-SURS-TF(LF)(SN)
designator J?, comment SM04B-SURS-TF(LF)(SN)
Conn Shrouded Header HDR 4 POS 0.8mm Solder RA SMD Embossed T/R; Manufacturer: JST; Body Plating: Tin; Current Rating: 500mA; Number of Poles: 4; Working Voltage: 30V; Gender: Male; Wire/Cable Gauge: 32AWG; Supplier 1: Digikey; Manufacturer Part Number: SM04B-SURS-TF(LF)(SN); RoHS: Yes; Category: Headers and Wire Housings; Stock 1: 12170; Pricing 1: 1=0.81, 10=0.702, 100=0.5791, 500=0.50356, 1000=0.41544 (USD); Mount: Surface Mount; Case/Package: SMD/SMT; Contact Plating: Tin; Contact Material: Copper Alloy,Bronze; Material: Polyamide; Contact Shape: Rectangular; Contact Finish - Mating: TIN; Insulation Material: Nylon; Insulation Color: Natural; Min Operating Temperature: -25°C; Max Operating Temperature: 85°C; Number of Rows: 1; Connector Type: Header; Termination: Solder; Number of Contacts: 4; Series: SUR; Fastening Type: Pull; Packaging: Cut Tape; Contact Type: Outer Shroud Contact; Number of Positions: 4; Voltage Rating: 30V; Voltage Rating (DC): 30V; Lead Pitch: 0.8mm; Reach SVHC Compliant: No; Lead Free: Lead Free; Flammability Rating: UL94 V-0; ComponentLink1URL: https://datasheet.ciiva.com/8052/1718811-8052273.pdf?src-supplier=Element14; ComponentLink1Description: https://datasheet.ciiva.com/8052/1718811-8052273.pdf?src-supplier=Element14; ComponentLink2URL: https://datasheet.ciiva.com/16487/esur-16487224.pdf?src-supplier=Future+Electronics; ComponentLink2Description: https://datasheet.ciiva.com/16487/esur-16487224.pdf?src-supplier=Future+Electronics; Supplier Part Number 1: 455-3589-1-ND
footprint CONN_SM04B-SURS-TF(LF)(SN) (, Right Angle 4 position 0.031" (0.80mm))
pins: 1, 2, 3, 4, SH

## CONN_JST_XH_2P_2.5mm
designator J?, comment S2B-XH-A(LF)(SN)